# Altium footprint library General.PcbLib: 446 footprints (part 4 of 28)
Each footprint in its own frame and in the unit in brackets; x right, y up, seen from the top. Pads: shape width x height; smd on the part's side, far side on the other; paste and mask are expansions set on the pad; w line width, h text height; cw(c..) or ccw(c..) is an arc to the next point about the centre after c.
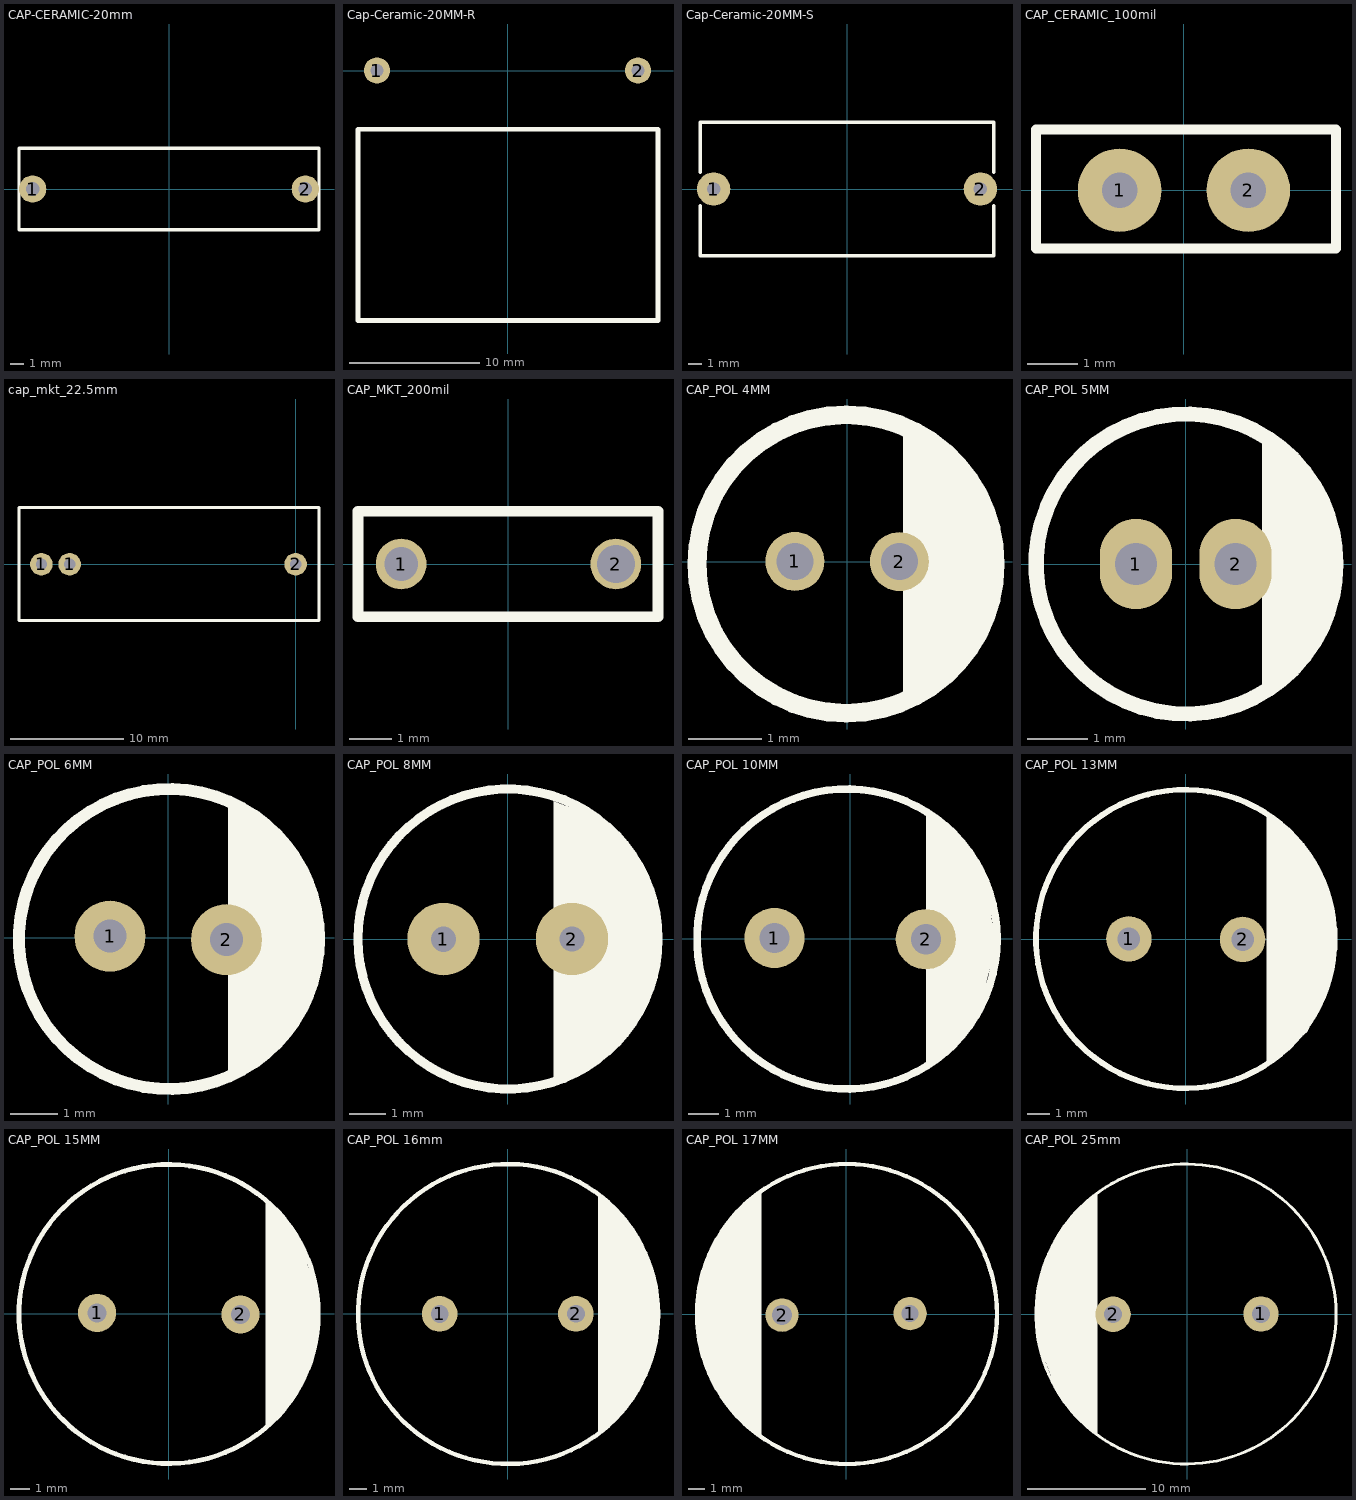
[diagram p3: the footprints below, top view; thin cyan lines are the x and y axes]

## CAP-CERAMIC-20mm [mm]
pads (2):
  round 2 hole 1: 1(-10,0) 2(10,0)
Top Overlay:
  lines w0.254: -11,-3 11,-3 11,3 -11,3 -11,-3
3D body "cap20mm.STEP": height 15.2, standoff -2, extent -10.699,-2.925 10.801,2.875

## Cap-Ceramic-20MM-R [mm]
pads (2):
  round 2 hole 1: 1(-10,0) 2(10,0)
Top Overlay:
  lines w0.381: -11.45,-19.15 -11.45,-4.5 11.525,-4.5 11.525,-19.15 -11.1,-19.15 -11.45,-19.15
3D body "cap20mmRight.step": height 13, standoff 0, extent -10.975,-19 11.025,0.4

## Cap-Ceramic-20MM-S [mm]
pads (2):
  round 2.5 hole 1: 1(-10,0) 2(10,0)
Top Overlay:
  lines w0.254: -11,-1.25 -11,-5 11,-5 11,-1.25 ; -11,1.25 -11,5 11,5 11,1.25
3D body "CL21_MEF_0_82UF_630V.step": height 17.5, standoff -1.9, extent -11,-8 11,5

## CAP_CERAMIC_100mil [mm]
pads (2):
  round 1.65 hole 0.7: 1(-1.27,0) 2(1.27,0)
Top Overlay:
  lines w0.2: 2.95,1.2 -2.919,1.2 -2.919,-1.15 3,-1.15 3,1.2
3D body "SW3dPS-Cap 100n.STEP": height 6.92, standoff -1, extent -2.919,-0.889 2.919,0.808

## cap_mkt_22.5mm [mm]
pads (3):
  round 2 hole 1: 1(-22.5,0) 1(-20,0) 2(0,0)
Top Overlay:
  lines w0.254: -24.483,-4.978 2.064,-4.978 2.064,5.022 -24.436,5.022 -24.483,5.022 -24.483,-4.978
3D body "CAP 27x10x20 P22_5.step": height 19.6, standoff -2.4, extent -24.436,-4.978 2.064,5.022

## CAP_MKT_200mil [mm] "200mil pin"
pads (2):
  round 1.2 hole 0.8: 1(-2.54,0)
  round 1.2 hole 0.9: 2(2.54,0)
Top Overlay:
  lines w0.254: -3.561,-1.25 3.539,-1.25 3.539,1.25 -3.561,1.25 -3.561,-1.25
3D body "User Library-B32529C_2_5x6_5x7_3.step": height 7.1, standoff -2.9, extent -3.625,-1.25 3.675,1.25

## CAP_POL 4MM [mm]
pads (2):
  round 0.8 hole 0.5: 1(-0.709,0.002) 2(0.709,-0.002)
Top Overlay:
  circle w0.254: c-0.014,-0.034 r2.023
  region: 0.762,1.778 1.27,1.524 1.524,1.27 2.032,0.254 2.032,-0.254 1.778,-1.016 0.762,-2.032
3D body "User Library-Cap 4x7.STEP": height 8.5, standoff -15.5, extent -2.048,-1.941 1.952,2.059

## CAP_POL 5MM [mm]
pads (2):
  oval 1.2x1.5 hole 0.7: 1(-0.827,0) 2(0.827,0)
Top Overlay:
  circle w0.254: c0.004,0.001 r2.491
  region: 1.27,-2.032 1.27,2.032 1.778,1.778 2.286,1.27 2.495,0.001 2.032,-1.524
3D body "User Library-CE_R200_D200_H460.STEP": height 11.7, standoff -4.9, extent -2.739,-2.6 2.841,2.479

## CAP_POL 6MM [mm]
pads (2):
  round 1.5 hole 0.7: 1(-1.231,0.037) 2(1.231,-0.037)
Top Overlay:
  circle w0.254: c0.016,-0.023 r3.171
  region: 1.27,-3.048 1.27,2.794 2.032,2.54 2.794,1.524 3.187,-0.023 2.794,-1.778
3D body "SW3dPS-Cap electro 6.3x11x2.5mm.STEP": height 11.53, standoff -3.01, extent -3.165,-3.154 3.185,3.197

## CAP_POL 8MM [mm]
pads (2):
  round 2 hole 0.7: 1(-1.775,-0.001) 2(1.775,0.001)
Top Overlay:
  circle w0.254: c0.007,0.001 r4.142
  region: 1.27,3.81 2.54,3.302 3.556,2.032 4.064,0.508 4.064,-0.762 3.556,-2.032 2.286,-3.556 1.27,-4.064
3D body "SW3dPS-Cap electro 8x11.5x3.5mm.STEP": height 12.03, standoff -3.48, extent -4.021,-3.975 4.03,4.075

## CAP_POL 10MM [mm]
pads (2):
  round 2 hole 1: 1(-2.517,0.02) 2(2.517,-0.02)
Top Overlay:
  circle w0.254: c-0.104,-0.012 r4.991
  region: 2.54,-4.318 2.54,4.318 3.81,3.048 4.572,1.524 4.826,-0.254 4.318,-2.286 3.302,-3.81
3D body "User Library-CE_R200_D400_H400.STEP": height 10.16, standoff -2.3, extent -5.131,-5.069 5.029,5.091

## CAP_POL 13MM [mm]
pads (2):
  round 2 hole 1: 1(-2.501,0.013) 2(2.501,-0.013)
Top Overlay:
  circle w0.254: c-0.017,0.007 r6.564
  region: 3.556,-5.588 3.556,5.588 4.572,4.826 5.842,3.048 6.604,0.508 6.35,-1.778 5.334,-4.064 3.81,-5.334
3D body "User Library-Capacitor, Al El, Thru Mt, 2200uF, 25V - CDE #SEK222M025ST.STEP": height 25.4, standoff -28.75, extent -6.6,-6.611 6.6,6.589

## CAP_POL 15MM [mm]
pads (2):
  round 2 hole 1: 1(-3.756,0.041) 2(3.756,-0.041)
Top Overlay:
  circle w0.254: c-0.009,-0.018 r7.845
  region: 5.08,5.842 6.604,4.318 7.62,1.524 7.874,-0.508 7.366,-2.54 6.858,-3.81 5.334,-5.842 5.08,-6.096
3D body "User Library-Cap16x25.STEP": height 25.5, standoff -18.5, extent -7.923,-7.921 8.077,8.079

## CAP_POL 16mm [mm]
pads (2):
  round 2 hole 1: 1(-3.821,-0.001) 2(3.821,0.001)
Top Overlay:
  circle w0.254: c0.011,-0.01 r8.416
  region: 5.08,6.858 5.08,-6.604 6.604,-5.334 7.62,-3.81 8.382,-1.016 8.382,1.524 7.62,3.81 6.35,5.588
3D body "User Library-CE_R300_D650_H1000.STEP": height 26.4, standoff -2.5, extent -8.231,-8.246 8.252,8.215

## CAP_POL 17MM [mm]
pads (2):
  round 2 hole 1: 1(3.83,0.047)
  round 2 hole 1.2: 2(-3.83,-0.047)
Top Overlay:
  circle w0.254: c0.057,0.021 r8.972
  region: -5.08,-7.366 -5.08,7.366 -6.858,5.842 -8.382,3.048 -8.89,0.762 -8.89,-1.016 -8.382,-3.302 -7.112,-5.334
3D body "User Library-Body_R300_D720_H620.STEP": height 16, standoff -2, extent -9.096,-8.931 8.904,9.032

## CAP_POL 25mm [mm]
pads (2):
  round 3 hole 1.5: 1(6.261,0.013) 2(-6.261,-0.013)
Top Overlay:
  circle w0.254: c-0.088,0.01 r12.702
  region: -7.62,-10.16 -7.62,10.16 -9.652,8.382 -11.684,5.334 -12.7,2.032 -12.7,-0.762 -12.446,-2.794 -11.176,-6.096 -9.906,-8.128 -8.382,-9.652
3D body "User Library-Cap 25x50.STEP": height 52, standoff -17, extent -12.506,-12.534 12.494,12.466